# Altium footprint library Supernova Connectors.PcbLib: 303 footprints (part 9 of 19)
Each footprint in its own frame and in the unit in brackets; x right, y up, seen from the top. Pads: shape width x height; smd on the part's side, far side on the other; paste and mask are expansions set on the pad; w line width, h text height; cw(c..) or ccw(c..) is an arc to the next point about the centre after c.
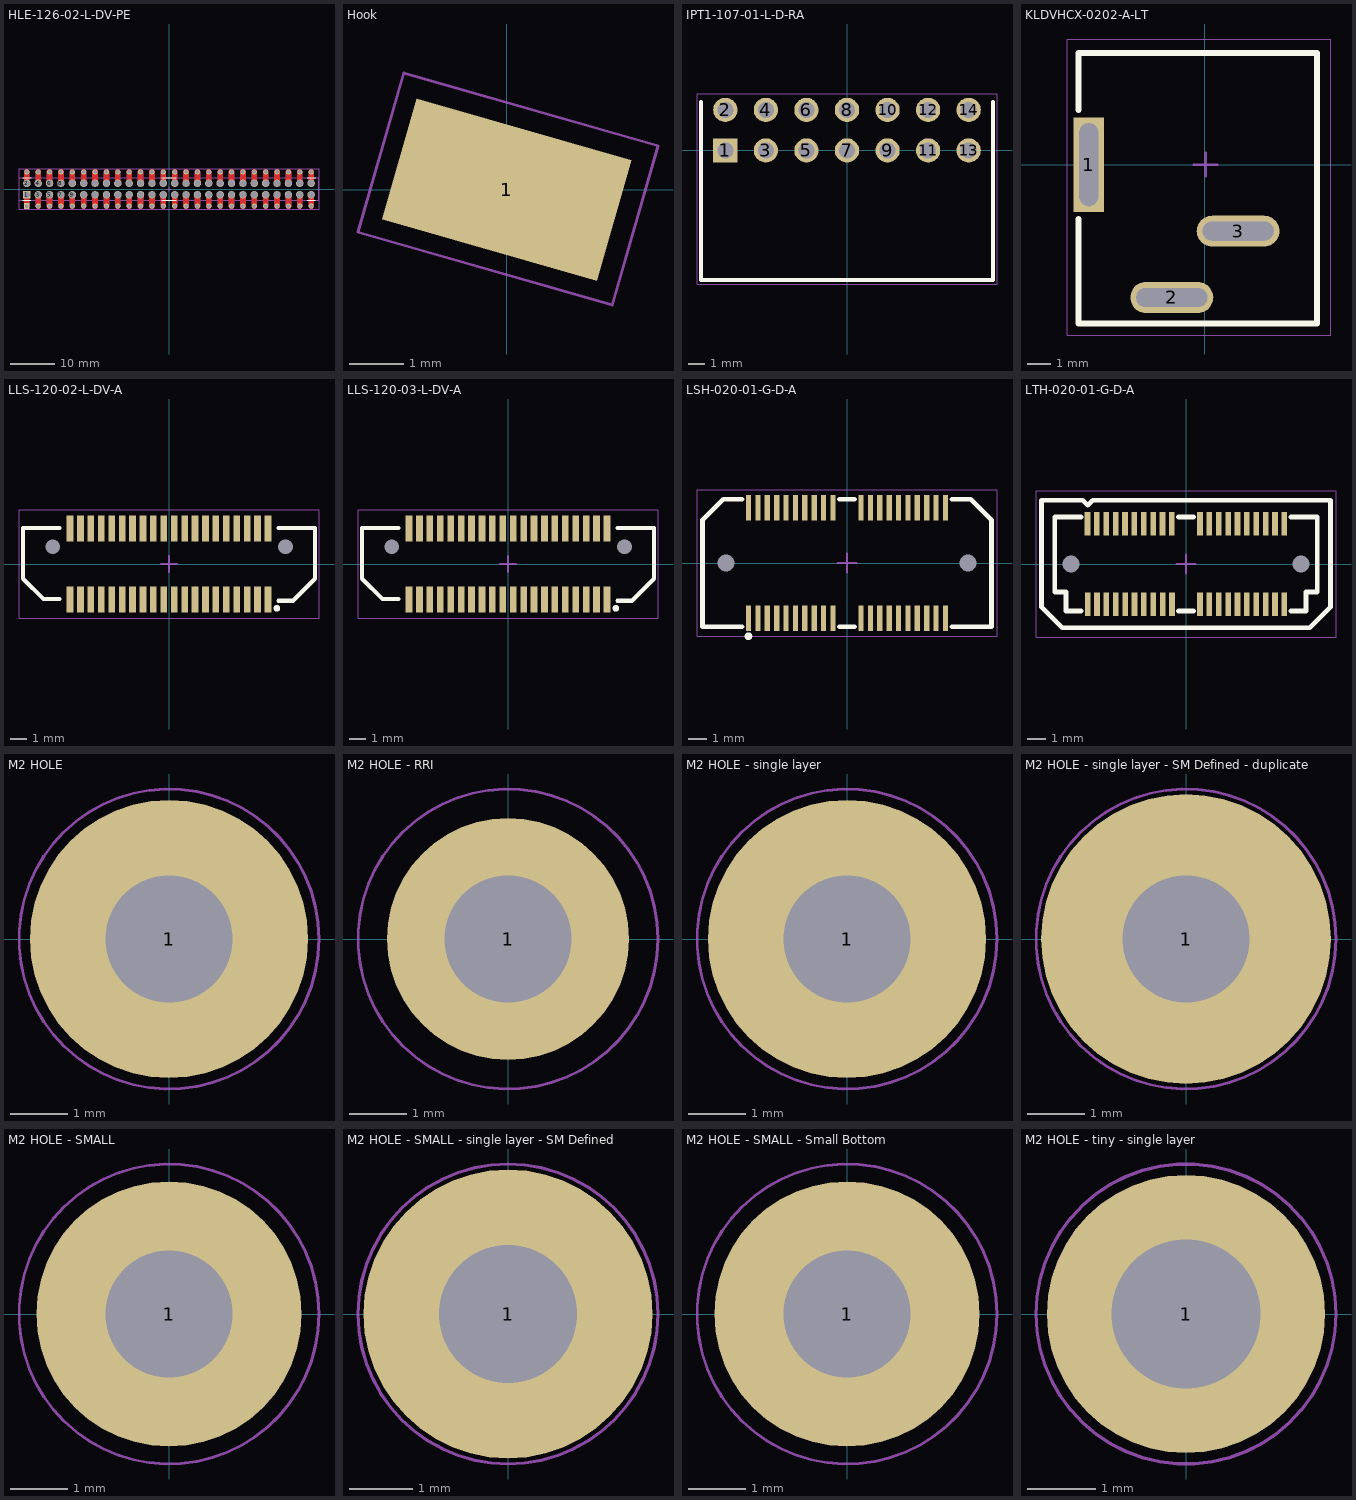
[diagram p8: the footprints below, top view; thin cyan lines are the x and y axes]

## HLE-126-02-L-DV-PE [mil] "HLE-126-02-L-DV-PE"
height 435.04
pads (104):
  rect 50x50 hole 30: 1(-1250,-150)
  rect 65x65 hole 55: 1(-1250,-50)
  round 65 hole 55: 2(-1250,50) 3(-1150,-50) 4(-1150,50) 5(-1050,-50) 6(-1050,50) 7(-950,-50) 8(-950,50) 9(-850,-50) 10(-850,50) 11(-750,-50) 12(-750,50) 13(-650,-50) 14(-650,50) 15(-550,-50) 16(-550,50) 17(-450,-50) 18(-450,50) 19(-350,-50) 20(-350,50) 21(-250,-50) 22(-250,50) 23(-150,-50) 24(-150,50) 25(-50,-50) 26(-50,50) 27(50,-50) 28(50,50) 29(150,-50) 30(150,50) 31(250,-50) 32(250,50) 33(350,-50) 34(350,50) 35(450,-50) 36(450,50) 37(550,-50) 38(550,50) 39(650,-50) 40(650,50) 41(750,-50) 42(750,50) 43(850,-50) 44(850,50) 45(950,-50) 46(950,50) 47(1050,-50) 48(1050,50) 49(1150,-50) 50(1150,50) 51(1250,-50) 52(1250,50)
  round 45 hole 30: 2(-1250,150) 3(-1150,-150) 4(-1150,150) 5(-1050,-150) 6(-1050,150) 7(-950,-150) 8(-950,150) 9(-850,-150) 10(-850,150) 11(-750,-150) 12(-750,150) 13(-650,-150) 14(-650,150) 15(-550,-150) 16(-550,150) 17(-450,-150) 18(-450,150) 19(-350,-150) 20(-350,150) 21(-250,-150) 22(-250,150) 23(-150,-150) 24(-150,150) 25(-50,-150) 26(-50,150) 27(50,-150) 28(50,150) 29(150,-150) 30(150,150) 31(250,-150) 32(250,150) 33(350,-150) 34(350,150) 35(450,-150) 36(450,150) 37(550,-150) 38(550,150) 39(650,-150) 40(650,150) 41(750,-150) 42(750,150) 43(850,-150) 44(850,150) 45(950,-150) 46(950,150) 47(1050,-150) 48(1050,150) 49(1150,-150) 50(1150,150) 51(1250,-150) 52(1250,150)
Top Layer:
  lines w50: -1250,-150 -1250,-50 ; -1250,50 -1250,150 ; -1150,-150 -1150,-50 ; -1150,50 -1150,150 ; -1050,-150 -1050,-50 ; -1050,50 -1050,150 ; -950,-150 -950,-50 ; -950,50 -950,150 ; -850,-150 -850,-50 ; -850,50 -850,150 ; -750,-150 -750,-50 ; -750,50 -750,150 ; -650,-150 -650,-50 ; -650,50 -650,150 ; -550,-150 -550,-50 ; -550,50 -550,150 ; -450,-150 -450,-50 ; -450,50 -450,150 ; -350,-150 -350,-50 ; -350,50 -350,150 ; -250,-150 -250,-50 ; -250,50 -250,150 ; -150,-150 -150,-50 ; -150,50 -150,150 ; -50,-150 -50,-50 ; -50,50 -50,150 ; 50,-150 50,-50 ; 50,50 50,150 ; 150,-150 150,-50 ; 150,50 150,150 ; 250,-150 250,-50 ; 250,50 250,150 ; 350,-150 350,-50 ; 350,50 350,150 ; 450,-150 450,-50 ; 450,50 450,150 ; 550,-150 550,-50 ; 550,50 550,150 ; 650,-150 650,-50 ; 650,50 650,150 ; 750,-150 750,-50 ; 750,50 750,150 ; 850,-150 850,-50 ; 850,50 850,150 ; 950,-150 950,-50 ; 950,50 950,150 ; 1050,-150 1050,-50 ; 1050,50 1050,150 ; 1150,-150 1150,-50 ; 1150,50 1150,150 ; 1250,-150 1250,-50 ; 1250,50 1250,150
Bottom Layer:
  lines w50: -1250,-150 -1250,-50 ; -1250,50 -1250,150 ; -1150,-150 -1150,-50 ; -1150,50 -1150,150 ; -1050,-150 -1050,-50 ; -1050,50 -1050,150 ; -950,-150 -950,-50 ; -950,50 -950,150 ; -850,-150 -850,-50 ; -850,50 -850,150 ; -750,-150 -750,-50 ; -750,50 -750,150 ; -650,-150 -650,-50 ; -650,50 -650,150 ; -550,-150 -550,-50 ; -550,50 -550,150 ; -450,-150 -450,-50 ; -450,50 -450,150 ; -350,-150 -350,-50 ; -350,50 -350,150 ; -250,-150 -250,-50 ; -250,50 -250,150 ; -150,-150 -150,-50 ; -150,50 -150,150 ; -50,-150 -50,-50 ; -50,50 -50,150 ; 50,-150 50,-50 ; 50,50 50,150 ; 150,-150 150,-50 ; 150,50 150,150 ; 250,-150 250,-50 ; 250,50 250,150 ; 350,-150 350,-50 ; 350,50 350,150 ; 450,-150 450,-50 ; 450,50 450,150 ; 550,-150 550,-50 ; 550,50 550,150 ; 650,-150 650,-50 ; 650,50 650,150 ; 750,-150 750,-50 ; 750,50 750,150 ; 850,-150 850,-50 ; 850,50 850,150 ; 950,-150 950,-50 ; 950,50 950,150 ; 1050,-150 1050,-50 ; 1050,50 1050,150 ; 1150,-150 1150,-50 ; 1150,50 1150,150 ; 1250,-150 1250,-50 ; 1250,50 1250,150
Top Overlay:
  lines w7.87: -1284.96,-98.43 -1214.09,-98.43 ; -1284.96,98.43 -1211.54,98.43 ; -63.07,-98.43 62.99,-98.43 ; -63.07,98.43 62.99,98.43 ; 1215.04,-98.43 1285.91,-98.43 ; 1215.04,98.43 1288.46,98.43
Top 3D Body:
  lines w3.94: -1314.96,-98.43 -1314.96,98.43 1314.96,98.43 1314.96,-98.43 -1314.96,-98.43
Top Courtyard:
  lines w3.94: -19.68,0 19.69,0 ; 0,-19.69 0,19.68 ; -1318.9,-180 -1318.9,180 1318.9,180 1318.9,-180 -1318.9,-180
3D body "HLE-126-02-L-DV-PE.stp": height 157.69, standoff -76.31, extent -1299.99,-152.99 1300.01,153

## Hook [mm]
pads (1):
  rect 4.1x2.3 smd rot 164 paste-0.3: 1(0,0)
Top Courtyard:
  lines w0.05: -2.727,-0.777 1.934,-2.114 2.77,0.803 -1.891,2.139 -2.727,-0.777
  lines w0.1: -0.481,0.138 0.481,-0.138 ; -0.138,-0.481 0.138,0.481
3D body "hook.STEP": height 2.3, standoff 0, extent -2.239,-1.521 2.247,1.529

## IPT1-107-01-L-D-RA [mil]
pads (14):
  rect 60x60 hole 39.37: 1(-300,0)
  round 60 hole 39.37: 2(-300,100) 3(-200,0) 4(-200,100) 5(-100,0) 6(-100,100) 7(0,0) 8(0,100) 9(100,0) 10(100,100) 11(200,0) 12(200,100) 13(300,0) 14(300,100)
Top Overlay:
  lines w10: -360,120 -360,-320 360,-320 360,120
Top Courtyard:
  lines w1.97: -370,-330 370,-330 370,140 -370,140 -370,-330
  lines w3.94: -19.68,0 19.68,0 ; 0,-19.68 0,19.69
3D body "IPT1-107-01-L-D-RA.stp": height 200, standoff -90, extent -359.99,-309.99 360.01,112.51

## KLDVHCX-0202-A-LT [mm]
pads (3):
  rect 1.3x4 hole 0.8 slot 3.5 at 90 deg: 1(-4.9,0)
  oval 3.5x1.3 hole 0.8 slot 3 at 0 deg: 2(-1.4,-5.6) 3(1.4,-2.8)
Top Overlay:
  lines w0.254: -5.334,-2.3 -5.334,-6.7 4.728,-6.7 4.728,4.7 -5.334,4.7 -5.334,2.3
Top Courtyard:
  lines w0.05: -5.8,-7.2 -5.8,5.3 5.3,5.3 5.3,-7.2 -5.8,-7.2
  lines w0.1: -0.472,0 0.528,0 ; 0.028,-0.5 0.028,0.5
3D body "KLDVHCX-0202-A-LT.step": height 14.3, standoff -3.5, extent -5.1,-6.5 4.5,4.5

## LLS-120-02-L-DV-A [mil] "40 pin hermapheroditic connector"
pads (42):
  rect 16x63 smd mask+1: 1(237.5,-85) 2(237.5,85) 3(212.5,-85) 4(212.5,85) 5(187.5,-85) 6(187.5,85) 7(162.5,-85) 8(162.5,85) 9(137.5,-85) 10(137.5,85) 11(112.5,-85) 12(112.5,85) 13(87.5,-85) 14(87.5,85) 15(62.5,-85) 16(62.5,85) 17(37.5,-85) 18(37.5,85) 19(12.5,-85) 20(12.5,85) 21(-12.5,-85) 22(-12.5,85) 23(-37.5,-85) 24(-37.5,85) 25(-62.5,-85) 26(-62.5,85) 27(-87.5,-85) 28(-87.5,85) 29(-112.5,-85) 30(-112.5,85) 31(-137.5,-85) 32(-137.5,85) 33(-162.5,-85) 34(-162.5,85) 35(-187.5,-85) 36(-187.5,85) 37(-212.5,-85) 38(-212.5,85) 39(-237.5,-85) 40(-237.5,85)
  round 30 hole 35 unplated: ""(-279.5,41.03) ""(279.5,41.03)
Top Overlay:
  circle w8: c258.98,-106.3 r4
  lines w10: -262.5,-84.25 -301.57,-84.25 -350.39,-35.43 -350.39,86.61 -262.5,86.61 ; 262.5,-88.19 297.64,-88.19 350.39,-35.43 350.39,86.61 262.5,86.61
Top Courtyard:
  lines w1.97: -360,-130 -360,130 360,130 360,-130 -360,-130
  lines w3.94: -19.68,0 19.68,0 ; 0,-19.68 0,19.69
3D body "LSS-120-02-X-DV-A.step": height 292.15, standoff -34.62, extent -343.5,-92.5 343.5,94.49

## LLS-120-03-L-DV-A [mil] "40 pin hermapheroditic connector"
pads (42):
  rect 16x63 smd mask+1: 1(237.5,-85) 2(237.5,85) 3(212.5,-85) 4(212.5,85) 5(187.5,-85) 6(187.5,85) 7(162.5,-85) 8(162.5,85) 9(137.5,-85) 10(137.5,85) 11(112.5,-85) 12(112.5,85) 13(87.5,-85) 14(87.5,85) 15(62.5,-85) 16(62.5,85) 17(37.5,-85) 18(37.5,85) 19(12.5,-85) 20(12.5,85) 21(-12.5,-85) 22(-12.5,85) 23(-37.5,-85) 24(-37.5,85) 25(-62.5,-85) 26(-62.5,85) 27(-87.5,-85) 28(-87.5,85) 29(-112.5,-85) 30(-112.5,85) 31(-137.5,-85) 32(-137.5,85) 33(-162.5,-85) 34(-162.5,85) 35(-187.5,-85) 36(-187.5,85) 37(-212.5,-85) 38(-212.5,85) 39(-237.5,-85) 40(-237.5,85)
  round 30 hole 35 unplated: ""(-279.5,41.03) ""(279.5,41.03)
Top Overlay:
  circle w8: c258.98,-106.3 r4
  lines w10: -262.5,-84.25 -301.57,-84.25 -350.39,-35.43 -350.39,86.61 -262.5,86.61 ; 262.5,-88.19 297.64,-88.19 350.39,-35.43 350.39,86.61 262.5,86.61
Top Courtyard:
  lines w1.97: -360,-130 -360,130 360,130 360,-130 -360,-130
  lines w3.94: -19.68,0 19.68,0 ; 0,-19.68 0,19.69
3D body "LSS-120-03-X-DV-A.step": height 214.57, standoff -33.46, extent -343.5,-93.5 343.5,93.49

## LSH-020-01-G-D-A [mm]
pads (42):
  rect 0.28x1.35 smd mask+0.025: 1(-5.25,-2.95) 2(-5.25,2.95) 3(-4.75,-2.95) 4(-4.75,2.95) 5(-4.25,-2.95) 6(-4.25,2.95) 7(-3.75,-2.95) 8(-3.75,2.95) 9(-3.25,-2.95) 10(-3.25,2.95) 11(-2.75,-2.95) 12(-2.75,2.95) 13(-2.25,-2.95) 14(-2.25,2.95) 15(-1.75,-2.95) 16(-1.75,2.95) 17(-1.25,-2.95) 18(-1.25,2.95) 19(-0.75,-2.95) 20(-0.75,2.95) 21(0.75,-2.95) 22(0.75,2.95) 23(1.25,-2.95) 24(1.25,2.95) 25(1.75,-2.95) 26(1.75,2.95) 27(2.25,-2.95) 28(2.25,2.95) 29(2.75,-2.95) 30(2.75,2.95) 31(3.25,-2.95) 32(3.25,2.95) 33(3.75,-2.95) 34(3.75,2.95) 35(4.25,-2.95) 36(4.25,2.95) 37(4.75,-2.95) 38(4.75,2.95) 39(5.25,-2.95) 40(5.25,2.95)
  round 0.5 hole 0.89 unplated: ""(-6.455,0) ""(6.455,0)
Top Overlay:
  circle w0.203: c-5.256,-3.9 r0.102
  lines w0.254: -5.6,-3.4 -7.7,-3.4 -7.7,2.3 -6.6,3.4 -5.6,3.4 ; -0.406,-3.4 0.394,-3.4 ; -0.4,3.4 0.4,3.4 ; 5.6,-3.4 7.7,-3.4 7.7,2.3 6.6,3.4 5.6,3.4
Top Courtyard:
  lines w0.05: -8,-3.9 -8,3.9 8,3.9 8,-3.9 -8,-3.9
  lines w0.1: -0.5,0 0.5,0 ; 0,-0.5 0,0.5
3D body "LSH-020-01-G-D-A.stp": height 1.9, standoff -0.77, extent -7.533,-3.365 7.534,3.366

## LTH-020-01-G-D-A [mm]
pads (42):
  rect 0.3x1.27 smd mask+0.025: 1(-5.25,2.15) 2(-5.25,-2.15) 3(-4.75,2.15) 4(-4.75,-2.15) 5(-4.25,2.15) 6(-4.25,-2.15) 7(-3.75,2.15) 8(-3.75,-2.15) 9(-3.25,2.15) 10(-3.25,-2.15) 11(-2.75,2.15) 12(-2.75,-2.15) 13(-2.25,2.15) 14(-2.25,-2.15) 15(-1.75,2.15) 16(-1.75,-2.15) 17(-1.25,2.15) 18(-1.25,-2.15) 19(-0.75,2.15) 20(-0.75,-2.15) 21(0.75,2.15) 22(0.75,-2.15) 23(1.25,2.15) 24(1.25,-2.15) 25(1.75,2.15) 26(1.75,-2.15) 27(2.25,2.15) 28(2.25,-2.15) 29(2.75,2.15) 30(2.75,-2.15) 31(3.25,2.15) 32(3.25,-2.15) 33(3.75,2.15) 34(3.75,-2.15) 35(4.25,2.15) 36(4.25,-2.15) 37(4.75,2.15) 38(4.75,-2.15) 39(5.25,2.15) 40(5.25,-2.15)
  round 0.5 hole 0.89 unplated: ""(-6.135,0) ""(6.135,0)
Top Overlay:
  lines w0.254: -5.6,-3.4 5.6,-3.4 ; -5.6,-2.5 -6.4,-2.5 -6.4,-1.5 -7,-1.5 -7,2.5 -5.6,2.5 ; -5.6,3.4 -7.7,3.4 -7.7,-2.3 -6.6,-3.4 -5.515,-3.4 ; -5.515,3.4 -5.245,3.13 -4.975,3.4 5.65,3.4 6.6,3.4 ; -0.4,-2.5 0.4,-2.5 ; -0.4,2.5 0.4,2.5 ; 5.515,-3.4 6.6,-3.4 7.7,-2.3 7.7,3.4 5.6,3.4 ; 5.6,-2.5 6.4,-2.5 6.4,-1.5 7,-1.5 7,2.5 5.6,2.5
Top Courtyard:
  lines w0.05: -8,-3.9 -8,3.9 8,3.9 8,-3.9 -8,-3.9
  lines w0.1: -0.5,0 0.5,0 ; 0,-0.5 0,0.5
3D body "LTH-020-01-G-D-A.stp": height 1.65, standoff -0.79, extent -6.898,-2.527 6.899,2.527

## M2 HOLE [mil]
pads (1):
  round 190 hole 86.61: 1(0,0)
Top Courtyard:
  circle w1.97: c0,0 r102.36

## M2 HOLE - RRI [mm]
pads (1):
  round 4.2 hole 2.2 mask+0.415: 1(0,0)
Top Courtyard:
  circle w0.05: c0,0 r2.6

## M2 HOLE - single layer [mil]
pads (1):
  round 190 / inner round 0 / far side round 0 hole 86.61 unplated: 1(0,0)
Top Courtyard:
  circle w1.97: c0,0 r102.36

## M2 HOLE - single layer - SM Defined - duplicate [mm]
pads (1):
  round 5.026 / inner round 0 / far side round 0 hole 2.2 unplated mask-0.2: 1(0,0)
Bottom Solder:
  region: 0,-1.1 -0.108,-1.1 -0.321,-1.058 -0.521,-0.975 -0.701,-0.854 -0.854,-0.701 -0.975,-0.521 -1.058,-0.321 -1.1,-0.108 -1.1,0 -1.1,0.108 -1.058,0.321 -0.975,0.521 -0.854,0.701 -0.701,0.854 -0.521,0.975 -0.321,1.058 -0.108,1.1 0,1.1 0.108,1.1 0.321,1.058 0.521,0.975 0.701,0.854 0.854,0.701 0.975,0.521 1.058,0.321 1.1,0.108 1.1,0 1.1,-0.108 1.058,-0.321 0.975,-0.521 0.854,-0.701 0.701,-0.854 0.521,-0.975 0.321,-1.058 0.108,-1.1
Top Courtyard:
  circle w0.05: c0,0 r2.6

## M2 HOLE - SMALL [mm]
pads (1):
  round 4.6 hole 2.2: 1(0,0)
Top Courtyard:
  circle w0.05: c0,0 r2.6

## M2 HOLE - SMALL - single layer - SM Defined [mm]
pads (1):
  round 4.6 / inner round 0 / far side round 0 hole 2.2 unplated mask-0.2: 1(0,0)
Bottom Solder:
  region: 0,-1.1 -0.108,-1.1 -0.321,-1.058 -0.521,-0.975 -0.701,-0.854 -0.854,-0.701 -0.975,-0.521 -1.058,-0.321 -1.1,-0.108 -1.1,0 -1.1,0.108 -1.058,0.321 -0.975,0.521 -0.854,0.701 -0.701,0.854 -0.521,0.975 -0.321,1.058 -0.108,1.1 0,1.1 0.108,1.1 0.321,1.058 0.521,0.975 0.701,0.854 0.854,0.701 0.975,0.521 1.058,0.321 1.1,0.108 1.1,0 1.1,-0.108 1.058,-0.321 0.975,-0.521 0.854,-0.701 0.701,-0.854 0.521,-0.975 0.321,-1.058 0.108,-1.1
Top Courtyard:
  circle w0.05: c0,0 r2.388

## M2 HOLE - SMALL - Small Bottom [mm]
pads (1):
  round 4.6 / inner round 3 / far side round 3 hole 2.2: 1(0,0)
Top Courtyard:
  circle w0.05: c0,0 r2.6

## M2 HOLE - tiny - single layer [mm]
pads (1):
  round 4.1 / inner round 0 / far side round 0 hole 2.2 unplated: 1(0,0)
Top Courtyard:
  circle w0.05: c0,0 r2.21